# Altium footprint library THU VIEN PCB.PCBLib: 911 footprints (part 57 of 57)
Each footprint in its own frame and in the unit in brackets; x right, y up, seen from the top. Pads: shape width x height; smd on the part's side, far side on the other; paste and mask are expansions set on the pad; w line width, h text height; cw(c..) or ccw(c..) is an arc to the next point about the centre after c.
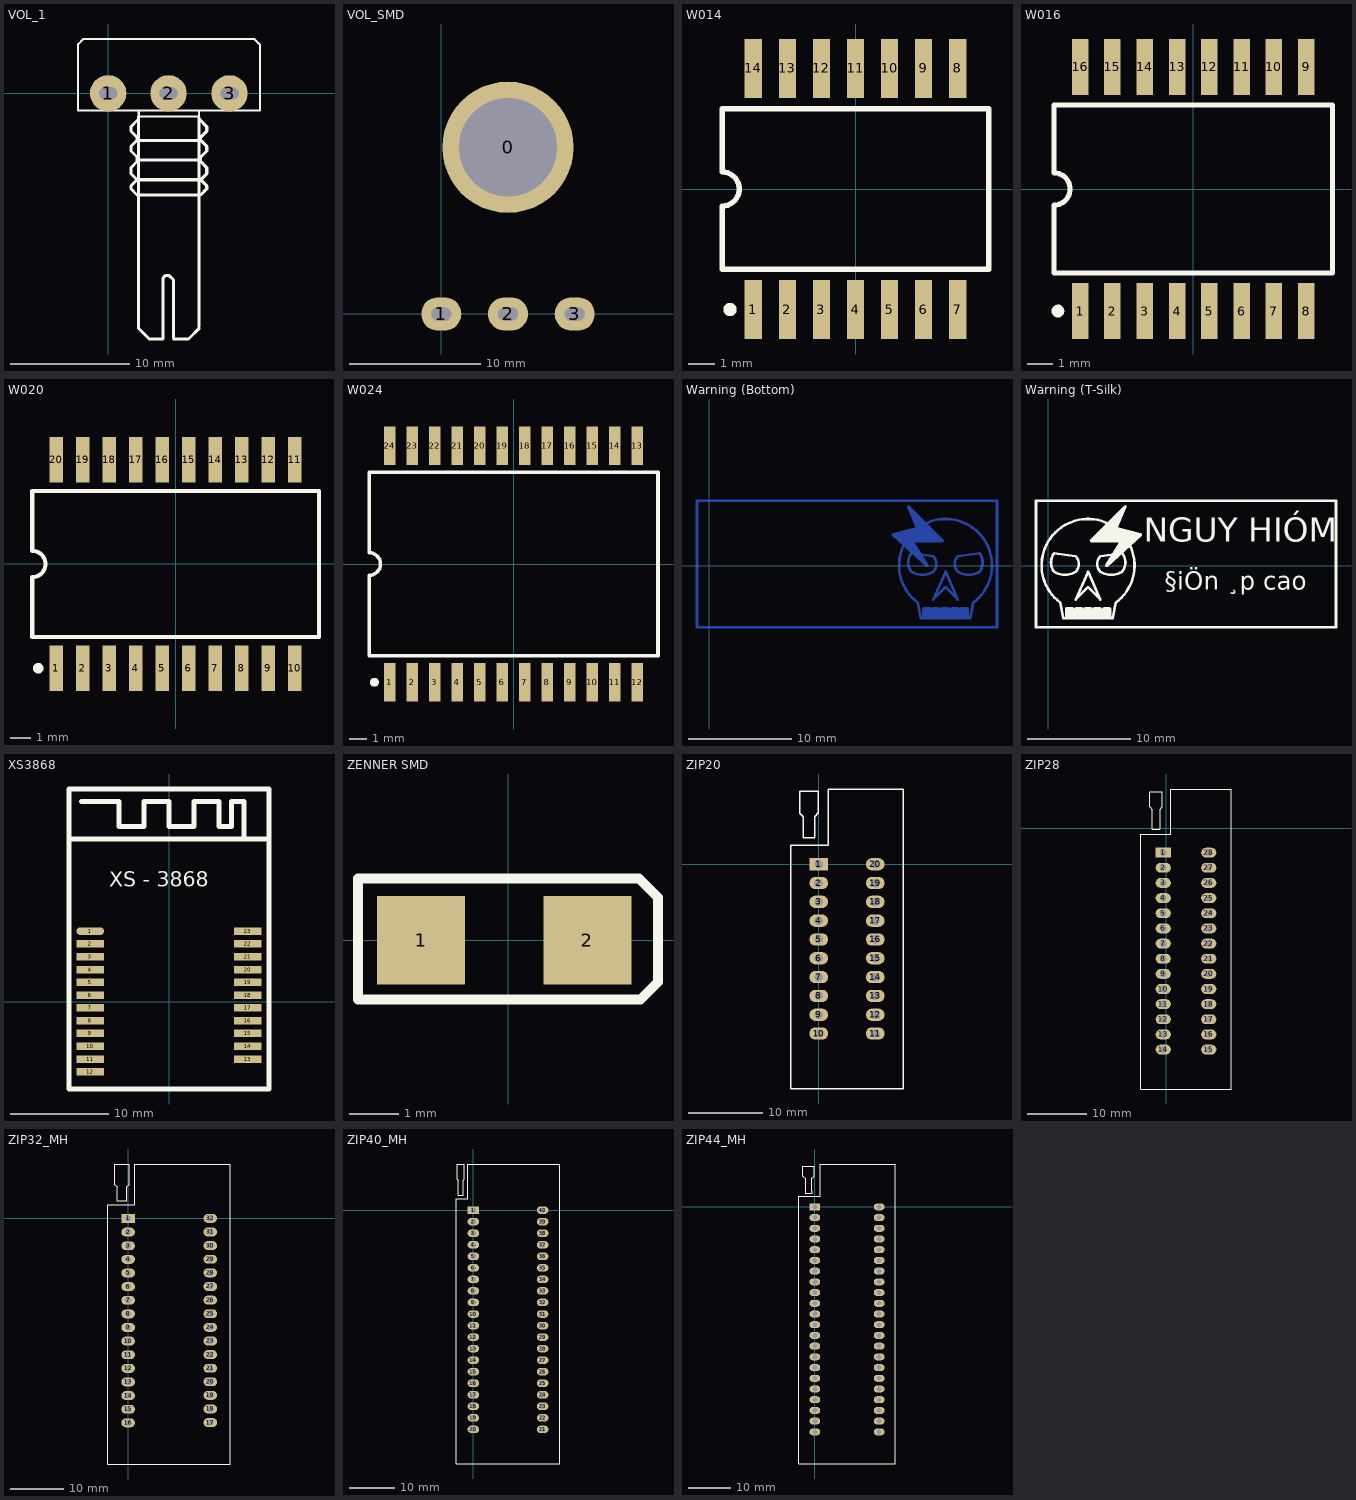
[diagram p56: the footprints below, top view; thin cyan lines are the x and y axes]

## VOL_1 [mil]
pads (3):
  round 120 hole 40 slot 60 at 0 deg: 1(0,0) 2(199,0) 3(400,0)
Top Overlay:
  lines w7: 100,-57 100,-77 299,-77 299,-57 ; 101,-77 101,-57 ; -99,-57 500,-57 500,161 482,179 -82,179 -99,162 -99,-57
  lines w10: 95,-335 75,-315 75,-305 95,-285 75,-265 75,-245 95,-225 95,-210 75,-190 75,-175 95,-155 95,-145 75,-125 75,-110 100,-85 ; 95,-220 300,-220 ; 100,-770 100,-77 ; 100,-760 100,-775 135,-810 180,-810 180,-610 190,-600 200,-600 215,-615 215,-805 ; 100,-335 305,-335 325,-315 325,-305 305,-285 ; 100,-285 305,-285 ; 105,-155 300,-155 ; 215,-810 265,-810 300,-775 ; 300,-770 300,-80 ; 300,-85 325,-110 325,-125 305,-145 305,-155 325,-175 325,-190 305,-210 305,-225 325,-245 325,-265 305,-285
3D body "SW3dPS-Pot.STEP": height 839.35, standoff -130, extent -110,-818.11 510,188.11

## VOL_SMD [mil]
pads (4):
  round 393.7 hole 295.28: 0(200,500)
  oval 120x100 hole 40 slot 60 at 0 deg: 1(0,0) 2(200,0) 3(400,0)
Bottom Overlay:
  circle w12: c400,150 r50
  circle w12: c200,150 r50
  circle w12: c0,150 r50
  circle w12: c200,500 r215.01
  lines w12: -57.25,301.71 cw(c200,500) 455.57,299.55 ; -55,299 127,299 ; -49,700 119,700 ; 281,298 455,298 ; 286,698 454,698 ; 455,295 500,250 500,-75 -100,-75 -100,255 ; -100,255 -55,300 -100,255
3D body "SW3dPS-omeg pot.STEP": height 866.14, standoff -407.48, extent -203.15,-247.08 600,947.08

## W014 [mm] "DFP; 14 Leads; Body 9.9 x 6.6 mm (LxW max); Pitch 1.27 mm"
height 2.03
pads (14):
  rect 0.65x2.2 smd: 1(-3.81,-4.5) 2(-2.54,-4.5) 3(-1.27,-4.5) 4(0,-4.5) 5(1.27,-4.5) 6(2.54,-4.5) 7(3.81,-4.5) 8(3.81,4.5) 9(2.54,4.5) 10(1.27,4.5) 11(0,4.5) 12(-1.27,4.5) 13(-2.54,4.5) 14(-3.81,4.5)
Top Overlay:
  circle w0.25: c-4.685,-4.5 r0.125
  lines w0.2: -4.975,-3 -4.975,-0.635 ccw(c-4.975,0) -4.975,0.635 -4.975,3 4.975,3 4.975,-3 -4.975,-3

## W016 [mm] "DFP; 16 Leads; Body 10.9 x 7.2 mm (LxW max); Pitch 1.27 mm"
height 2.03
pads (16):
  rect 0.65x2.2 smd: 1(-4.445,-4.8) 2(-3.175,-4.8) 3(-1.905,-4.8) 4(-0.635,-4.8) 5(0.635,-4.8) 6(1.905,-4.8) 7(3.175,-4.8) 8(4.445,-4.8) 9(4.445,4.8) 10(3.175,4.8) 11(1.905,4.8) 12(0.635,4.8) 13(-0.635,4.8) 14(-1.905,4.8) 15(-3.175,4.8) 16(-4.445,4.8)
Top Overlay:
  circle w0.25: c-5.32,-4.8 r0.125
  lines w0.2: -5.475,-3.3 5.475,-3.3 5.475,3.3 -5.475,3.3 -5.475,0.635 cw(c-5.475,0) -5.475,-0.635 -5.475,-3.3

## W020 [mm] "DFP; 20 Leads; Body 13.7 x 7.6 mm (LxW max); Pitch 1.27 mm"
height 2.54
pads (20):
  rect 0.65x2.2 smd: 1(-5.715,-5) 2(-4.445,-5) 3(-3.175,-5) 4(-1.905,-5) 5(-0.635,-5) 6(0.635,-5) 7(1.905,-5) 8(3.175,-5) 9(4.445,-5) 10(5.715,-5) 11(5.715,5) 12(4.445,5) 13(3.175,5) 14(1.905,5) 15(0.635,5) 16(-0.635,5) 17(-1.905,5) 18(-3.175,5) 19(-4.445,5) 20(-5.715,5)
Top Overlay:
  circle w0.25: c-6.59,-5 r0.125
  lines w0.2: -6.875,-3.5 -6.875,-0.635 ccw(c-6.875,0) -6.875,0.635 -6.875,3.5 6.875,3.5 6.875,-3.5 -6.875,-3.5

## W024 [mm] "DFP; 24 Leads; Body 16.3 x 9.5 mm (LxW max); Pitch 1.27 mm"
height 2.29
pads (24):
  rect 0.65x2.2 smd: 1(-6.985,-6.675) 2(-5.715,-6.675) 3(-4.445,-6.675) 4(-3.175,-6.675) 5(-1.905,-6.675) 6(-0.635,-6.675) 7(0.635,-6.675) 8(1.905,-6.675) 9(3.175,-6.675) 10(4.445,-6.675) 11(5.715,-6.675) 12(6.985,-6.675) 13(6.985,6.675) 14(5.715,6.675) 15(4.445,6.675) 16(3.175,6.675) 17(1.905,6.675) 18(0.635,6.675) 19(-0.635,6.675) 20(-1.905,6.675) 21(-3.175,6.675) 22(-4.445,6.675) 23(-5.715,6.675) 24(-6.985,6.675)
Top Overlay:
  circle w0.25: c-7.86,-6.675 r0.125
  lines w0.2: -8.15,-5.175 -8.15,-0.635 ccw(c-8.15,0) -8.15,0.635 -8.15,5.175 8.15,5.175 8.15,-5.175 -8.15,-5.175

## Warning (Bottom) [mil]
Bottom Layer:
  region: 760.38,229.5 759.27,229.49 758.54,228.74 757.57,228.34 757.15,227.32 756.38,226.53 756.39,225.48 755.99,224.52 756.41,223.49 756.43,222.38 789.37,145.51 701,123.43 699.74,122.5 698.31,121.82 698.12,121.3 697.68,120.97 697.44,119.41 696.91,117.93 697.15,117.42 697.07,116.87 698,115.6 698.68,114.18 828.66,-4 829.96,-4.47 831.08,-5.27 831.84,-5.15 832.56,-5.41 833.81,-4.82 835.17,-4.59 835.61,-3.97 836.3,-3.64 836.77,-2.34 837.57,-1.22 837.45,-0.46 837.71,0.26 837.12,1.51 836.89,2.87 782.98,89.12 891.38,89.12 895.21,90.71 896.8,94.53 895.21,98.36 765.23,228.34 764.2,228.77 763.41,229.54 762.37,229.53 761.4,229.93
  region: 958.46,-161.61 956.87,-165.43 956.87,-200.88 958.46,-204.71 962.28,-206.3 985.92,-206.3 989.74,-204.71 991.33,-200.88 991.33,-165.43 989.74,-161.61 985.92,-160.02 962.28,-160.02
  region: 852.11,-161.61 850.52,-165.43 850.52,-200.88 852.11,-204.71 855.93,-206.3 879.57,-206.3 883.39,-204.71 884.98,-200.88 884.98,-165.43 883.39,-161.61 879.57,-160.02 855.93,-160.02
  region: 816.66,-161.61 815.07,-165.43 815.07,-200.88 816.66,-204.71 820.48,-206.3 844.12,-206.3 847.94,-204.71 849.53,-200.88 849.53,-165.43 847.94,-161.61 844.12,-160.02 820.48,-160.02
  region: 923.01,-161.61 921.42,-165.43 921.42,-200.88 923.01,-204.71 926.83,-206.3 950.47,-206.3 954.29,-204.71 955.88,-200.88 955.88,-165.43 954.29,-161.61 950.47,-160.02 926.83,-160.02
  region: 887.56,-161.61 885.97,-165.43 885.97,-200.88 887.56,-204.71 891.38,-206.3 915,-206.3 918.83,-204.71 920.41,-200.88 920.41,-165.43 918.83,-161.61 915,-160.02 891.38,-160.02
  lines w10: -47.27,-236.33 1100,-236.33 1100,248.15 -47.27,248.15 -47.27,-236.33 ; 702.32,118.18 796.85,141.8 761.4,224.52 891.38,94.53 773.22,94.53 832.3,0 702.32,118.18 ; 773.22,-23.63 ccw(c814.58,41.35) 855.93,-23.63 ccw(c826.4,5.9) 855.93,35.45 773.22,47.27 ccw(c814.58,11.82) 773.22,-23.63 ; 796.85,-141.8 cw(c903.2,0.53) 1009.55,-141.8 997.73,-200.88 808.67,-200.88 796.85,-141.8 ; 855.93,-129.98 903.2,-23.63 950.47,-129.98 903.2,-82.72 855.93,-129.98 ; 950.46,-23.64 cw(c980,5.9) 950.47,35.45 1033.18,47.27 cw(c985.92,11.82) 1033.18,-23.63 cw(c991.83,41.35) 950.47,-23.63
  text "§iÖn ¸p cao" at 580,-120 h118.11
  text "NGUY HIÓM" at 690,45 h157.48

## Warning (T-Silk) [mil]
Top Overlay:
  region: 294.62,229.5 295.73,229.49 296.46,228.74 297.43,228.34 297.85,227.32 298.62,226.53 298.61,225.48 299.01,224.52 298.59,223.49 298.57,222.38 265.63,145.51 354,123.43 355.26,122.5 356.69,121.82 356.88,121.3 357.32,120.97 357.56,119.41 358.09,117.93 357.85,117.42 357.93,116.87 357,115.6 356.32,114.18 226.34,-4 225.04,-4.47 223.92,-5.27 223.16,-5.15 222.44,-5.41 221.19,-4.82 219.83,-4.59 219.39,-3.97 218.7,-3.64 218.23,-2.34 217.43,-1.22 217.55,-0.46 217.29,0.26 217.88,1.51 218.11,2.87 272.02,89.12 163.62,89.12 159.79,90.71 158.2,94.53 159.79,98.36 289.77,228.34 290.8,228.77 291.59,229.54 292.63,229.53 293.6,229.93
  region: 96.54,-161.61 98.13,-165.43 98.13,-200.88 96.54,-204.71 92.72,-206.3 69.08,-206.3 65.26,-204.71 63.67,-200.88 63.67,-165.43 65.26,-161.61 69.08,-160.02 92.72,-160.02
  region: 202.89,-161.61 204.48,-165.43 204.48,-200.88 202.89,-204.71 199.07,-206.3 175.43,-206.3 171.61,-204.71 170.02,-200.88 170.02,-165.43 171.61,-161.61 175.43,-160.02 199.07,-160.02
  region: 238.34,-161.61 239.93,-165.43 239.93,-200.88 238.34,-204.71 234.52,-206.3 210.88,-206.3 207.06,-204.71 205.47,-200.88 205.47,-165.43 207.06,-161.61 210.88,-160.02 234.52,-160.02
  region: 131.99,-161.61 133.58,-165.43 133.58,-200.88 131.99,-204.71 128.17,-206.3 104.53,-206.3 100.71,-204.71 99.12,-200.88 99.12,-165.43 100.71,-161.61 104.53,-160.02 128.17,-160.02
  region: 167.44,-161.61 169.03,-165.43 169.03,-200.88 167.44,-204.71 163.62,-206.3 140,-206.3 136.17,-204.71 134.59,-200.88 134.59,-165.43 136.17,-161.61 140,-160.02 163.62,-160.02
  lines w10: -47.27,-236.33 1100,-236.33 1100,248.15 -47.27,248.15 -47.27,-236.33 ; 21.82,-23.63 cw(c69.08,11.82) 21.82,47.27 104.53,35.45 cw(c75,5.9) 104.54,-23.64 cw(c63.17,41.35) 21.81,-23.64 ; 45.45,-141.8 cw(c151.8,0.53) 258.15,-141.8 246.33,-200.88 57.27,-200.88 45.45,-141.8 ; 104.53,-129.98 151.8,-82.72 199.07,-129.98 151.8,-23.63 104.53,-129.98 ; 163.62,94.53 281.78,94.53 222.7,0 352.68,118.18 258.15,141.8 293.6,224.52 163.62,94.53 ; 199.07,-23.63 ccw(c240.42,41.35) 281.78,-23.63 ccw(c240.42,11.82) 281.78,47.27 199.07,35.45 ccw(c228.6,5.9) 199.06,-23.64
  text "§iÖn ¸p cao" at 445,-115 h118.11
  text "NGUY HIÓM" at 365,60 h157.48

## XS3868 [mil]
height 104.33
pads (23):
  oval 110x30 smd: 1(-314.96,281.5)
  rect 110x30 smd: 2(-314.96,230.31) 3(-314.96,179.13) 4(-314.96,127.95) 5(-314.96,76.77) 6(-314.96,25.59) 7(-314.96,-25.59) 8(-314.96,-76.77) 9(-314.96,-127.95) 10(-314.96,-179.13) 11(-314.96,-230.31) 12(-314.96,-281.5) 13(314.96,-230.31) 14(314.96,-179.13) 15(314.96,-127.95) 16(314.96,-76.77) 17(314.96,-25.59) 18(314.96,25.59) 19(314.96,76.77) 20(314.96,127.95) 21(314.96,179.13) 22(314.96,230.31) 23(314.96,281.5)
Top Overlay:
  lines w20: -400,650 400,650 ; -350,800 -200,800 -200,700 -100,700 -100,800 0,800 0,700 100,700 100,800 200,800 200,700 250,700 250,800 300,800 300,650 ; -400,-350 400,-350 400,850 -400,850 -400,-350
  text "XS - 3868" at -240,460 h60

## ZENNER SMD [mil]
pads (2):
  rect 70x70 smd: 1(-69,0) 2(63,0)
Top Overlay:
  lines w7.87: -119,-47 105,-47 119,-33 119,-6.54 119,34 104,49 -119,49 -119,-47
3D body "User Library-SOD80C-1.STEP": height 62.99, standoff 0, extent -71.83,-32 73.83,30.99

## ZIP20 [mil] "DIP 20, W 600mil/ L 1600mil"
height 300
pads (20):
  rect 100x65 hole 45: 1(0,0)
  oval 100x65 hole 45: 2(0,-100) 3(0,-200) 4(0,-300) 5(0,-400) 6(0,-500) 7(0,-600) 8(0,-700) 9(0,-800) 10(0,-900) 11(300,-900) 12(300,-800) 13(300,-700) 14(300,-600) 15(300,-500) 16(300,-400) 17(300,-300) 18(300,-200) 19(300,-100) 20(300,0)
Top Overlay:
  lines w7: -83.5,140.5 -23.5,140.5 -22.5,141.5 ; -83,142 -83,251 ; -83,251.5 -83,253 -101,271 -101,387 -2,387 -2,273 -22.5,252.5 -22.5,142.5 ; -150,-1195 450,-1195 450,400 50,400 50,100 -150,100 -150,-1195

## ZIP28 [mil]
height 12
pads (28):
  rect 100x65 hole 45: 1(-20,-160)
  oval 100x65 hole 45: 2(-20,-260) 3(-20,-360) 4(-20,-460) 5(-20,-560) 6(-20,-660) 7(-20,-760) 8(-20,-860) 9(-20,-960) 10(-20,-1060) 11(-20,-1160) 12(-20,-1260) 13(-20,-1360) 14(-20,-1460) 15(280,-1460) 16(280,-1360) 17(280,-1260) 18(280,-1160) 19(280,-1060) 20(280,-960) 21(280,-860) 22(280,-760) 23(280,-660) 24(280,-560) 25(280,-460) 26(280,-360) 27(280,-260) 28(280,-160)
Top Overlay:
  lines w7: -110.5,217 -110.5,242.5 -110,243 -106.5,243 ; -110.5,218 -110.5,142 -93,124.5 -93,107 ; -108,243 -25.5,243 -25.5,142 -41.5,126 -41.5,101 ; -93.5,-5.5 -42,-5.5 ; -93,-5 -93,109.5 ; -41.5,-5.5 -41.5,103 ; -170,-1720 430,-1720 430,260 30,260 30,-40 -170,-40 -170,-1720

## ZIP32_MH [mil] "32 PIN, W 900 mil , L 2200 mil , Push Pro FOR Chip"
height 300
pads (32):
  rect 100x65 hole 45: 1(0,-0.5)
  oval 100x65 hole 45: 2(0,-100.5) 3(0,-200.5) 4(0,-300.5) 5(0,-400.5) 6(0,-500.5) 7(0,-600.5) 8(0,-700.5) 9(0,-800.5) 10(0,-900.5) 11(0,-1000.5) 12(0,-1100.5) 13(0,-1200.5) 14(0,-1300.5) 15(0,-1400.5) 16(0,-1500.5) 17(603,-1498.5) 18(603,-1398.5) 19(603,-1298.5) 20(603,-1198.5) 21(603,-1099.5) 22(603,-999.5) 23(603,-899.5) 24(603,-799.5) 25(603,-699.5) 26(603,-599.5) 27(603,-499.5) 28(603,-399.5) 29(603,-299.5) 30(603,-199.5) 31(603,-99.5) 32(603,0.5)
Top Overlay:
  lines w7: -97.5,398 -97.5,248.5 -81,232 -81,129.5 ; -96,398.5 9,398.5 9,385 ; -81.5,129.5 -11.5,129.5 -9,132 ; -9,129.5 -9,231 9,249 9,386 ; -150,-1802.5 750,-1802.5 750,399.5 600,399.5 50,399.5 50,99.5 -150,99.5 -150,-1802.5

## ZIP40_MH [mil] "40 PIN, W 900 mil , L 2600 mil , Push Pro FOR Chip"
height 300
pads (40):
  rect 100x65 hole 45: 1(0,0)
  oval 100x65 hole 45: 2(0,-100) 3(0,-200) 4(0,-300) 5(0,-400) 6(0,-500) 7(0,-600) 8(0,-700) 9(0,-800) 10(0,-900) 11(0,-1000) 12(0,-1100) 13(0,-1200) 14(0,-1300) 15(0,-1400) 16(0,-1500) 17(0,-1600) 18(0,-1700) 19(0,-1800) 20(0,-1900) 21(600,-1900) 22(600,-1800) 23(600,-1700) 24(600,-1600) 25(600,-1500) 26(600,-1400) 27(600,-1300) 28(600,-1200) 29(600,-1100) 30(600,-1000) 31(600,-900) 32(600,-800) 33(600,-700) 34(600,-600) 35(600,-500) 36(600,-400) 37(600,-300) 38(600,-200) 39(600,-100) 40(600,0)
Top Overlay:
  lines w7: -150,100 -150,-2200 750,-2200 750,400 600,400 50,400
  lines w7.01: -150,100 -50,100 -50,400 50,400 ; -140,270 -130,260 -130,130 -110,130 -90,130 -90,260 -80,270 -80,400 -140,400 -140,270
3D body "SW3dPS-zif.STEP": height 443.07, standoff -186.85, extent -189.6,-2144.51 750,894.51

## ZIP44_MH [mil] "44PIN, W 900 mil , L 2600 mil , Push Pro FOR Chip"
height 300
pads (44):
  rect 100x65 hole 45: 1(0,0)
  oval 100x65 hole 45: 2(0,-100) 3(0,-200) 4(0,-300) 5(0,-400) 6(0,-500) 7(0,-600) 8(0,-700) 9(0,-800) 10(0,-900) 11(0,-1000) 12(0,-1100) 13(0,-1200) 14(0,-1300) 15(0,-1400) 16(0,-1500) 17(0,-1600) 18(0,-1700) 19(0,-1800) 20(0,-1900) 21(0,-2000) 22(0,-2100) 23(600,-2100) 24(600,-2000) 25(600,-1900) 26(600,-1800) 27(600,-1700) 28(600,-1600) 29(600,-1500) 30(600,-1400) 31(600,-1300) 32(600,-1200) 33(600,-1100) 34(600,-1000) 35(600,-900) 36(600,-800) 37(600,-700) 38(600,-600) 39(600,-500) 40(600,-400) 41(600,-300) 42(600,-200) 43(600,-100) 44(600,0)
Top Overlay:
  lines w7: -150,-2400 750,-2400 750,400 600,400 50,400 50,100 -150,100 -150,-2400
  lines w10: -87.5,128 -27.5,128 -26.5,129 -26.5,148.5 ; -87,129.5 -87,263.5 ; -87,265.5 -89,265.5 -111.5,288 -111.5,379 -5.5,379 -4.5,378 -4.5,287.5 -27,265 ; -27,146 -27,265.5 -26,265.5